# Altium schematic symbol library WR-TBL_Pluggable PCB Header.SchLib: 719 symbols (part 3 of 5) (continued)
## 691322310021
designator P?
WR-TBL Serie 322 Horizontal PCB Header, Pluggable, pitch 3.81mm, 21p; Part Number: 691322310021; Compliance: RoHS; Modularity: No; Pin Number: 21; Rated Current [UL]: 10A; Working Voltage [UL]: 300VAC; ComponentLink1Description: Manufacturer; ComponentLink1URL: http://www.we-online.de; ComponentLink2URL: https://katalog.we-online.de/em/datasheet/691322310021.pdf; ComponentLink2Description: Datasheet; Mounting Technology: THT; Packaging: Box; Operating Temperature: -40 to +105degC; PCB/Cable/Panel: PCB; Pitch: 3.81mm; Published Date: October 2019; Type: Horizontal; Publisher: Wurth Elektronik; Application: Pluggable
footprint 691322310021
pins: 1, 2, 3, 4, 5, 6, 7, 8, 9, 10, 11, 12, 13, 14, 15, 16, 17, 18, 19, 20, 21

## 691322310022
designator P?
WR-TBL Serie 322 Horizontal PCB Header, Pluggable, pitch 3.81mm, 22p; Part Number: 691322310022; Compliance: RoHS; Modularity: No; Pin Number: 22; Rated Current [UL]: 10A; Working Voltage [UL]: 300VAC; ComponentLink1Description: Manufacturer; ComponentLink1URL: http://www.we-online.de; ComponentLink2URL: https://katalog.we-online.de/em/datasheet/691322310022.pdf; ComponentLink2Description: Datasheet; Mounting Technology: THT; Packaging: Box; Operating Temperature: -40 to +105degC; PCB/Cable/Panel: PCB; Pitch: 3.81mm; Published Date: October 2019; Type: Horizontal; Publisher: Wurth Elektronik; Application: Pluggable
footprint 691322310022
pins: 1, 2, 3, 4, 5, 6, 7, 8, 9, 10, 11, 12, 13, 14, 15, 16, 17, 18, 19, 20, 21, 22

## 691322310023
designator P?
WR-TBL Serie 322 Horizontal PCB Header, Pluggable, pitch 3.81mm, 23p; Part Number: 691322310023; Compliance: RoHS; Modularity: No; Pin Number: 23; Rated Current [UL]: 10A; Working Voltage [UL]: 300VAC; ComponentLink1Description: Manufacturer; ComponentLink1URL: http://www.we-online.de; ComponentLink2URL: https://katalog.we-online.de/em/datasheet/691322310023.pdf; ComponentLink2Description: Datasheet; Mounting Technology: THT; Packaging: Box; Operating Temperature: -40 to +105degC; PCB/Cable/Panel: PCB; Pitch: 3.81mm; Published Date: October 2019; Type: Horizontal; Publisher: Wurth Elektronik; Application: Pluggable
footprint 691322310023
pins: 1, 2, 3, 4, 5, 6, 7, 8, 9, 10, 11, 12, 13, 14, 15, 16, 17, 18, 19, 20, 21, 22, 23

## 691322310024
designator P?
WR-TBL Serie 322 Horizontal PCB Header, Pluggable, pitch 3.81mm, 24p; Part Number: 691322310024; Compliance: RoHS; Modularity: No; Pin Number: 24; Rated Current [UL]: 10A; Working Voltage [UL]: 300VAC; ComponentLink1Description: Manufacturer; ComponentLink1URL: http://www.we-online.de; ComponentLink2URL: https://katalog.we-online.de/em/datasheet/691322310024.pdf; ComponentLink2Description: Datasheet; Mounting Technology: THT; Packaging: Box; Operating Temperature: -40 to +105degC; PCB/Cable/Panel: PCB; Pitch: 3.81mm; Published Date: October 2019; Type: Horizontal; Publisher: Wurth Elektronik; Application: Pluggable
footprint 691322310024
pins: 1, 2, 3, 4, 5, 6, 7, 8, 9, 10, 11, 12, 13, 14, 15, 16, 17, 18, 19, 20, 21, 22, 23, 24

## 691323100002
designator P?
WR-TBL Serie 3231 Vertical PCB Header with Flanges, Pluggable, pitch 3.5mm, 2p; Part Number: 691323100002; Compliance: RoHS; Modularity: No; Pin Number: 2; Rated Current [UL]: 10A; Working Voltage [UL]: 300VAC; ComponentLink1Description: Manufacturer; ComponentLink1URL: http://www.we-online.de; ComponentLink2URL: https://katalog.we-online.de/em/datasheet/691323100002.pdf; ComponentLink2Description: Datasheet; Mounting Technology: THT; Packaging: Box; Operating Temperature: -40 to +105degC; PCB/Cable/Panel: PCB; Pitch: 3.5mm; Published Date: October 2019; Type: Vertical; Publisher: Wurth Elektronik; Application: Pluggable
footprint 691323100002
pins: 1, 2

## 691323100003
designator P?
WR-TBL Serie 3231 Vertical PCB Header with Flanges, Pluggable, pitch 3.5mm, 3p; Part Number: 691323100003; Compliance: RoHS; Modularity: No; Pin Number: 3; Rated Current [UL]: 10A; Working Voltage [UL]: 300VAC; ComponentLink1Description: Manufacturer; ComponentLink1URL: http://www.we-online.de; ComponentLink2URL: https://katalog.we-online.de/em/datasheet/691323100003.pdf; ComponentLink2Description: Datasheet; Mounting Technology: THT; Packaging: Box; Operating Temperature: -40 to +105degC; PCB/Cable/Panel: PCB; Pitch: 3.5mm; Published Date: October 2019; Type: Vertical; Publisher: Wurth Elektronik; Application: Pluggable
footprint 691323100003
pins: 1, 2, 3

## 691323100004
designator P?
WR-TBL Serie 3231 Vertical PCB Header with Flanges, Pluggable, pitch 3.5mm, 4p; Part Number: 691323100004; Compliance: RoHS; Modularity: No; Pin Number: 4; Rated Current [UL]: 10A; Working Voltage [UL]: 300VAC; ComponentLink1Description: Manufacturer; ComponentLink1URL: http://www.we-online.de; ComponentLink2URL: https://katalog.we-online.de/em/datasheet/691323100004.pdf; ComponentLink2Description: Datasheet; Mounting Technology: THT; Packaging: Box; Operating Temperature: -40 to +105degC; PCB/Cable/Panel: PCB; Pitch: 3.5mm; Published Date: October 2019; Type: Vertical; Publisher: Wurth Elektronik; Application: Pluggable
footprint 691323100004
pins: 1, 2, 3, 4

## 691323100005
designator P?
WR-TBL Serie 3231 Vertical PCB Header with Flanges, Pluggable, pitch 3.5mm, 5p; Part Number: 691323100005; Compliance: RoHS; Modularity: No; Pin Number: 5; Rated Current [UL]: 10A; Working Voltage [UL]: 300VAC; ComponentLink1Description: Manufacturer; ComponentLink1URL: http://www.we-online.de; ComponentLink2URL: https://katalog.we-online.de/em/datasheet/691323100005.pdf; ComponentLink2Description: Datasheet; Mounting Technology: THT; Packaging: Box; Operating Temperature: -40 to +105degC; PCB/Cable/Panel: PCB; Pitch: 3.5mm; Published Date: October 2019; Type: Vertical; Publisher: Wurth Elektronik; Application: Pluggable
footprint 691323100005
pins: 1, 2, 3, 4, 5

## 691323100006
designator P?
WR-TBL Serie 3231 Vertical PCB Header with Flanges, Pluggable, pitch 3.5mm, 6p; Part Number: 691323100006; Compliance: RoHS; Modularity: No; Pin Number: 6; Rated Current [UL]: 10A; Working Voltage [UL]: 300VAC; ComponentLink1Description: Manufacturer; ComponentLink1URL: http://www.we-online.de; ComponentLink2URL: https://katalog.we-online.de/em/datasheet/691323100006.pdf; ComponentLink2Description: Datasheet; Mounting Technology: THT; Packaging: Box; Operating Temperature: -40 to +105degC; PCB/Cable/Panel: PCB; Pitch: 3.5mm; Published Date: October 2019; Type: Vertical; Publisher: Wurth Elektronik; Application: Pluggable
footprint 691323100006
pins: 1, 2, 3, 4, 5, 6

## 691323100007
designator P?
WR-TBL Serie 3231 Vertical PCB Header with Flanges, Pluggable, pitch 3.5mm, 7p; Part Number: 691323100007; Compliance: RoHS; Modularity: No; Pin Number: 7; Rated Current [UL]: 10A; Working Voltage [UL]: 300VAC; ComponentLink1Description: Manufacturer; ComponentLink1URL: http://www.we-online.de; ComponentLink2URL: https://katalog.we-online.de/em/datasheet/691323100007.pdf; ComponentLink2Description: Datasheet; Mounting Technology: THT; Packaging: Box; Operating Temperature: -40 to +105degC; PCB/Cable/Panel: PCB; Pitch: 3.5mm; Published Date: October 2019; Type: Vertical; Publisher: Wurth Elektronik; Application: Pluggable
footprint 691323100007
pins: 1, 2, 3, 4, 5, 6, 7

## 691323100008
designator P?
WR-TBL Serie 3231 Vertical PCB Header with Flanges, Pluggable, pitch 3.5mm, 8p; Part Number: 691323100008; Compliance: RoHS; Modularity: No; Pin Number: 8; Rated Current [UL]: 10A; Working Voltage [UL]: 300VAC; ComponentLink1Description: Manufacturer; ComponentLink1URL: http://www.we-online.de; ComponentLink2URL: https://katalog.we-online.de/em/datasheet/691323100008.pdf; ComponentLink2Description: Datasheet; Mounting Technology: THT; Packaging: Box; Operating Temperature: -40 to +105degC; PCB/Cable/Panel: PCB; Pitch: 3.5mm; Published Date: October 2019; Type: Vertical; Publisher: Wurth Elektronik; Application: Pluggable
footprint 691323100008
pins: 1, 2, 3, 4, 5, 6, 7, 8

## 691323100012
designator P?
WR-TBL Serie 3231 Vertical PCB Header with Flanges, Pluggable, pitch 3.5mm, 12p; Part Number: 691323100012; Compliance: RoHS; Modularity: No; Pin Number: 12; Rated Current [UL]: 10A; Working Voltage [UL]: 300VAC; ComponentLink1Description: Manufacturer; ComponentLink1URL: http://www.we-online.de; ComponentLink2URL: https://katalog.we-online.de/em/datasheet/691323100012.pdf; ComponentLink2Description: Datasheet; Mounting Technology: THT; Packaging: Box; Operating Temperature: -40 to +105degC; PCB/Cable/Panel: PCB; Pitch: 3.5mm; Published Date: October 2019; Type: Vertical; Publisher: Wurth Elektronik; Application: Pluggable
footprint 691323100012
pins: 1, 2, 3, 4, 5, 6, 7, 8, 9, 10, 11, 12

## 691323300002
designator P?
WR-TBL Serie 3233 Vertical PCB Header with Flanges, Pluggable, pitch 3.81mm, 2p; Part Number: 691323300002; Compliance: RoHS; Modularity: No; Pin Number: 2; Rated Current [UL]: 10A; Working Voltage [UL]: 300VAC; ComponentLink1Description: Manufacturer; ComponentLink1URL: http://www.we-online.de; ComponentLink2URL: https://katalog.we-online.de/em/datasheet/691323300002.pdf; ComponentLink2Description: Datasheet; Mounting Technology: THT; Packaging: Box; Operating Temperature: -40 to +105degC; PCB/Cable/Panel: PCB; Pitch: 3.81mm; Published Date: October 2019; Type: Vertical; Publisher: Wurth Elektronik; Application: Pluggable
footprint 691323300002
pins: 1, 2

## 691323300003
designator P?
WR-TBL Serie 3233 Vertical PCB Header with Flanges, Pluggable, pitch 3.81mm, 3p; Part Number: 691323300003; Compliance: RoHS; Modularity: No; Pin Number: 3; Rated Current [UL]: 10A; Working Voltage [UL]: 300VAC; ComponentLink1Description: Manufacturer; ComponentLink1URL: http://www.we-online.de; ComponentLink2URL: https://katalog.we-online.de/em/datasheet/691323300003.pdf; ComponentLink2Description: Datasheet; Mounting Technology: THT; Packaging: Box; Operating Temperature: -40 to +105degC; PCB/Cable/Panel: PCB; Pitch: 3.81mm; Published Date: October 2019; Type: Vertical; Publisher: Wurth Elektronik; Application: Pluggable
footprint 691323300003
pins: 1, 2, 3

## 691323300004
designator P?
WR-TBL Serie 3233 Vertical PCB Header with Flanges, Pluggable, pitch 3.81mm, 4p; Part Number: 691323300004; Compliance: RoHS; Modularity: No; Pin Number: 4; Rated Current [UL]: 10A; Working Voltage [UL]: 300VAC; ComponentLink1Description: Manufacturer; ComponentLink1URL: http://www.we-online.de; ComponentLink2URL: https://katalog.we-online.de/em/datasheet/691323300004.pdf; ComponentLink2Description: Datasheet; Mounting Technology: THT; Packaging: Box; Operating Temperature: -40 to +105degC; PCB/Cable/Panel: PCB; Pitch: 3.81mm; Published Date: October 2019; Type: Vertical; Publisher: Wurth Elektronik; Application: Pluggable
footprint 691323300004
pins: 1, 2, 3, 4

## 691323300005
designator P?
WR-TBL Serie 3233 Vertical PCB Header with Flanges, Pluggable, pitch 3.81mm, 5p; Part Number: 691323300005; Compliance: RoHS; Modularity: No; Pin Number: 5; Rated Current [UL]: 10A; Working Voltage [UL]: 300VAC; ComponentLink1Description: Manufacturer; ComponentLink1URL: http://www.we-online.de; ComponentLink2URL: https://katalog.we-online.de/em/datasheet/691323300005.pdf; ComponentLink2Description: Datasheet; Mounting Technology: THT; Packaging: Box; Operating Temperature: -40 to +105degC; PCB/Cable/Panel: PCB; Pitch: 3.81mm; Published Date: October 2019; Type: Vertical; Publisher: Wurth Elektronik; Application: Pluggable
footprint 691323300005
pins: 1, 2, 3, 4, 5

## 691323300006
designator P?
WR-TBL Serie 3233 Vertical PCB Header with Flanges, Pluggable, pitch 3.81mm, 6p; Part Number: 691323300006; Compliance: RoHS; Modularity: No; Pin Number: 6; Rated Current [UL]: 10A; Working Voltage [UL]: 300VAC; ComponentLink1Description: Manufacturer; ComponentLink1URL: http://www.we-online.de; ComponentLink2URL: https://katalog.we-online.de/em/datasheet/691323300006.pdf; ComponentLink2Description: Datasheet; Mounting Technology: THT; Packaging: Box; Operating Temperature: -40 to +105degC; PCB/Cable/Panel: PCB; Pitch: 3.81mm; Published Date: October 2019; Type: Vertical; Publisher: Wurth Elektronik; Application: Pluggable
footprint 691323300006
pins: 1, 2, 3, 4, 5, 6

## 691323300007
designator P?
WR-TBL Serie 3233 Vertical PCB Header with Flanges, Pluggable, pitch 3.81mm, 7p; Part Number: 691323300007; Compliance: RoHS; Modularity: No; Pin Number: 7; Rated Current [UL]: 10A; Working Voltage [UL]: 300VAC; ComponentLink1Description: Manufacturer; ComponentLink1URL: http://www.we-online.de; ComponentLink2URL: https://katalog.we-online.de/em/datasheet/691323300007.pdf; ComponentLink2Description: Datasheet; Mounting Technology: THT; Packaging: Box; Operating Temperature: -40 to +105degC; PCB/Cable/Panel: PCB; Pitch: 3.81mm; Published Date: October 2019; Type: Vertical; Publisher: Wurth Elektronik; Application: Pluggable
footprint 691323300007
pins: 1, 2, 3, 4, 5, 6, 7

## 691323300008
designator P?
WR-TBL Serie 3233 Vertical PCB Header with Flanges, Pluggable, pitch 3.81mm, 8p; Part Number: 691323300008; Compliance: RoHS; Modularity: No; Pin Number: 8; Rated Current [UL]: 10A; Working Voltage [UL]: 300VAC; ComponentLink1Description: Manufacturer; ComponentLink1URL: http://www.we-online.de; ComponentLink2URL: https://katalog.we-online.de/em/datasheet/691323300008.pdf; ComponentLink2Description: Datasheet; Mounting Technology: THT; Packaging: Box; Operating Temperature: -40 to +105degC; PCB/Cable/Panel: PCB; Pitch: 3.81mm; Published Date: October 2019; Type: Vertical; Publisher: Wurth Elektronik; Application: Pluggable
footprint 691323300008
pins: 1, 2, 3, 4, 5, 6, 7, 8

## 691323300012
designator P?
WR-TBL Serie 3233 Vertical PCB Header with Flanges, Pluggable, pitch 3.81mm, 12p; Part Number: 691323300012; Compliance: RoHS; Modularity: No; Pin Number: 12; Rated Current [UL]: 10A; Working Voltage [UL]: 300VAC; ComponentLink1Description: Manufacturer; ComponentLink1URL: http://www.we-online.de; ComponentLink2URL: https://katalog.we-online.de/em/datasheet/691323300012.pdf; ComponentLink2Description: Datasheet; Mounting Technology: THT; Packaging: Box; Operating Temperature: -40 to +105degC; PCB/Cable/Panel: PCB; Pitch: 3.81mm; Published Date: October 2019; Type: Vertical; Publisher: Wurth Elektronik; Application: Pluggable
footprint 691323300012
pins: 1, 2, 3, 4, 5, 6, 7, 8, 9, 10, 11, 12

## 691325110002
designator P?
WR-TBL Serie 3251 Horizontal PCB Header with Flanges, Pluggable, pitch 3.5mm, 2p; Part Number: 691325110002; Compliance: RoHS; Modularity: No; Pin Number: 2; Rated Current [UL]: 10A; Working Voltage [UL]: 300VAC; ComponentLink1Description: Manufacturer; ComponentLink1URL: http://www.we-online.de; ComponentLink2URL: https://katalog.we-online.de/em/datasheet/691325110002.pdf; ComponentLink2Description: Datasheet; Mounting Technology: THT; Packaging: Box; Operating Temperature: -40 to +105degC; PCB/Cable/Panel: PCB; Pitch: 3.5mm; Published Date: October 2019; Type: Horizontal; Publisher: Wurth Elektronik; Application: Pluggable
footprint 691325110002
pins: 1, 2

## 691325110003
designator P?
WR-TBL Serie 3251 Horizontal PCB Header with Flanges, Pluggable, pitch 3.5mm, 3p; Part Number: 691325110003; Compliance: RoHS; Modularity: No; Pin Number: 3; Rated Current [UL]: 10A; Working Voltage [UL]: 300VAC; ComponentLink1Description: Manufacturer; ComponentLink1URL: http://www.we-online.de; ComponentLink2URL: https://katalog.we-online.de/em/datasheet/691325110003.pdf; ComponentLink2Description: Datasheet; Mounting Technology: THT; Packaging: Box; Operating Temperature: -40 to +105degC; PCB/Cable/Panel: PCB; Pitch: 3.5mm; Published Date: October 2019; Type: Horizontal; Publisher: Wurth Elektronik; Application: Pluggable
footprint 691325110003
pins: 1, 2, 3

## 691325110004
designator P?
WR-TBL Serie 3251 Horizontal PCB Header with Flanges, Pluggable, pitch 3.5mm, 4p; Part Number: 691325110004; Compliance: RoHS; Modularity: No; Pin Number: 4; Rated Current [UL]: 10A; Working Voltage [UL]: 300VAC; ComponentLink1Description: Manufacturer; ComponentLink1URL: http://www.we-online.de; ComponentLink2URL: https://katalog.we-online.de/em/datasheet/691325110004.pdf; ComponentLink2Description: Datasheet; Mounting Technology: THT; Packaging: Box; Operating Temperature: -40 to +105degC; PCB/Cable/Panel: PCB; Pitch: 3.5mm; Published Date: October 2019; Type: Horizontal; Publisher: Wurth Elektronik; Application: Pluggable
footprint 691325110004
pins: 1, 2, 3, 4

## 691325110005
designator P?
WR-TBL Serie 3251 Horizontal PCB Header with Flanges, Pluggable, pitch 3.5mm, 5p; Part Number: 691325110005; Compliance: RoHS; Modularity: No; Pin Number: 5; Rated Current [UL]: 10A; Working Voltage [UL]: 300VAC; ComponentLink1Description: Manufacturer; ComponentLink1URL: http://www.we-online.de; ComponentLink2URL: https://katalog.we-online.de/em/datasheet/691325110005.pdf; ComponentLink2Description: Datasheet; Mounting Technology: THT; Packaging: Box; Operating Temperature: -40 to +105degC; PCB/Cable/Panel: PCB; Pitch: 3.5mm; Published Date: October 2019; Type: Horizontal; Publisher: Wurth Elektronik; Application: Pluggable
footprint 691325110005
pins: 1, 2, 3, 4, 5

## 691325110006
designator P?
WR-TBL Serie 3251 Horizontal PCB Header with Flanges, Pluggable, pitch 3.5mm, 6p; Part Number: 691325110006; Compliance: RoHS; Modularity: No; Pin Number: 6; Rated Current [UL]: 10A; Working Voltage [UL]: 300VAC; ComponentLink1Description: Manufacturer; ComponentLink1URL: http://www.we-online.de; ComponentLink2URL: https://katalog.we-online.de/em/datasheet/691325110006.pdf; ComponentLink2Description: Datasheet; Mounting Technology: THT; Packaging: Box; Operating Temperature: -40 to +105degC; PCB/Cable/Panel: PCB; Pitch: 3.5mm; Published Date: October 2019; Type: Horizontal; Publisher: Wurth Elektronik; Application: Pluggable
footprint 691325110006
pins: 1, 2, 3, 4, 5, 6

## 691325110007
designator P?
WR-TBL Serie 3251 Horizontal PCB Header with Flanges, Pluggable, pitch 3.5mm, 7p; Part Number: 691325110007; Compliance: RoHS; Modularity: No; Pin Number: 7; Rated Current [UL]: 10A; Working Voltage [UL]: 300VAC; ComponentLink1Description: Manufacturer; ComponentLink1URL: http://www.we-online.de; ComponentLink2URL: https://katalog.we-online.de/em/datasheet/691325110007.pdf; ComponentLink2Description: Datasheet; Mounting Technology: THT; Packaging: Box; Operating Temperature: -40 to +105degC; PCB/Cable/Panel: PCB; Pitch: 3.5mm; Published Date: October 2019; Type: Horizontal; Publisher: Wurth Elektronik; Application: Pluggable
footprint 691325110007
pins: 1, 2, 3, 4, 5, 6, 7

## 691325110008
designator P?
WR-TBL Serie 3251 Horizontal PCB Header with Flanges, Pluggable, pitch 3.5mm, 8p; Part Number: 691325110008; Compliance: RoHS; Modularity: No; Pin Number: 8; Rated Current [UL]: 10A; Working Voltage [UL]: 300VAC; ComponentLink1Description: Manufacturer; ComponentLink1URL: http://www.we-online.de; ComponentLink2URL: https://katalog.we-online.de/em/datasheet/691325110008.pdf; ComponentLink2Description: Datasheet; Mounting Technology: THT; Packaging: Box; Operating Temperature: -40 to +105degC; PCB/Cable/Panel: PCB; Pitch: 3.5mm; Published Date: October 2019; Type: Horizontal; Publisher: Wurth Elektronik; Application: Pluggable
footprint 691325110008
pins: 1, 2, 3, 4, 5, 6, 7, 8

## 691325110012
designator P?
WR-TBL Serie 3251 Horizontal PCB Header with Flanges, Pluggable, pitch 3.5mm, 12p; Part Number: 691325110012; Compliance: RoHS; Modularity: No; Pin Number: 12; Rated Current [UL]: 10A; Working Voltage [UL]: 300VAC; ComponentLink1Description: Manufacturer; ComponentLink1URL: http://www.we-online.de; ComponentLink2URL: https://katalog.we-online.de/em/datasheet/691325110012.pdf; ComponentLink2Description: Datasheet; Mounting Technology: THT; Packaging: Box; Operating Temperature: -40 to +105degC; PCB/Cable/Panel: PCB; Pitch: 3.5mm; Published Date: October 2019; Type: Horizontal; Publisher: Wurth Elektronik; Application: Pluggable
footprint 691325110012
pins: 1, 2, 3, 4, 5, 6, 7, 8, 9, 10, 11, 12

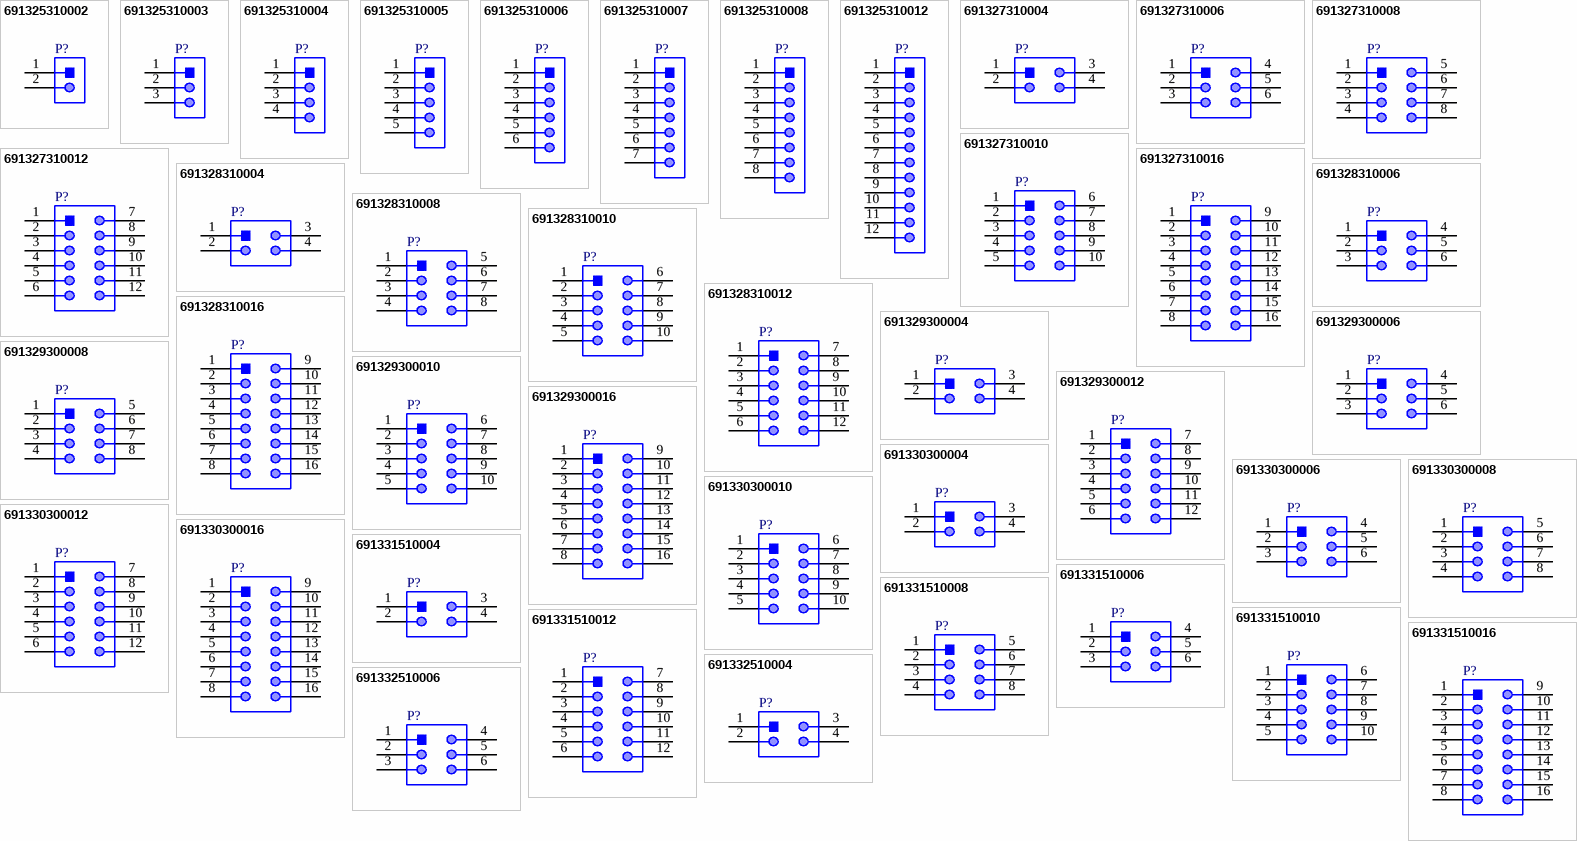
[diagram p11: symbols 691325310002 to 691332510006]

## 691325310002
designator P?
WR-TBL Serie 3253 Horizontal PCB Header with Flanges, Pluggable, pitch 3.81mm, 2p; Part Number: 691325310002; Compliance: RoHS; Modularity: No; Pin Number: 2; Rated Current [UL]: 10A; Working Voltage [UL]: 300VAC; ComponentLink1Description: Manufacturer; ComponentLink1URL: http://www.we-online.de; ComponentLink2URL: https://katalog.we-online.de/em/datasheet/691325310002.pdf; ComponentLink2Description: Datasheet; Mounting Technology: THT; Packaging: Box; Operating Temperature: -40 to +105degC; PCB/Cable/Panel: PCB; Pitch: 3.81mm; Published Date: October 2019; Type: Horizontal; Publisher: Wurth Elektronik; Application: Pluggable
footprint 691325310002
pins: 1, 2

## 691325310003
designator P?
WR-TBL Serie 3253 Horizontal PCB Header with Flanges, Pluggable, pitch 3.81mm, 3p; Part Number: 691325310003; Compliance: RoHS; Modularity: No; Pin Number: 3; Rated Current [UL]: 10A; Working Voltage [UL]: 300VAC; ComponentLink1Description: Manufacturer; ComponentLink1URL: http://www.we-online.de; ComponentLink2URL: https://katalog.we-online.de/em/datasheet/691325310003.pdf; ComponentLink2Description: Datasheet; Mounting Technology: THT; Packaging: Box; Operating Temperature: -40 to +105degC; PCB/Cable/Panel: PCB; Pitch: 3.81mm; Published Date: October 2019; Type: Horizontal; Publisher: Wurth Elektronik; Application: Pluggable
footprint 691325310003
pins: 1, 2, 3

## 691325310004
designator P?
WR-TBL Serie 3253 Horizontal PCB Header with Flanges, Pluggable, pitch 3.81mm, 4p; Part Number: 691325310004; Compliance: RoHS; Modularity: No; Pin Number: 4; Rated Current [UL]: 10A; Working Voltage [UL]: 300VAC; ComponentLink1Description: Manufacturer; ComponentLink1URL: http://www.we-online.de; ComponentLink2URL: https://katalog.we-online.de/em/datasheet/691325310004.pdf; ComponentLink2Description: Datasheet; Mounting Technology: THT; Packaging: Box; Operating Temperature: -40 to +105degC; PCB/Cable/Panel: PCB; Pitch: 3.81mm; Published Date: October 2019; Type: Horizontal; Publisher: Wurth Elektronik; Application: Pluggable
footprint 691325310004
pins: 1, 2, 3, 4

## 691325310005
designator P?
WR-TBL Serie 3253 Horizontal PCB Header with Flanges, Pluggable, pitch 3.81mm, 5p; Part Number: 691325310005; Compliance: RoHS; Modularity: No; Pin Number: 5; Rated Current [UL]: 10A; Working Voltage [UL]: 300VAC; ComponentLink1Description: Manufacturer; ComponentLink1URL: http://www.we-online.de; ComponentLink2URL: https://katalog.we-online.de/em/datasheet/691325310005.pdf; ComponentLink2Description: Datasheet; Mounting Technology: THT; Packaging: Box; Operating Temperature: -40 to +105degC; PCB/Cable/Panel: PCB; Pitch: 3.81mm; Published Date: October 2019; Type: Horizontal; Publisher: Wurth Elektronik; Application: Pluggable
footprint 691325310005
pins: 1, 2, 3, 4, 5

## 691325310006
designator P?
WR-TBL Serie 3253 Horizontal PCB Header with Flanges, Pluggable, pitch 3.81mm, 6p; Part Number: 691325310006; Compliance: RoHS; Modularity: No; Pin Number: 6; Rated Current [UL]: 10A; Working Voltage [UL]: 300VAC; ComponentLink1Description: Manufacturer; ComponentLink1URL: http://www.we-online.de; ComponentLink2URL: https://katalog.we-online.de/em/datasheet/691325310006.pdf; ComponentLink2Description: Datasheet; Mounting Technology: THT; Packaging: Box; Operating Temperature: -40 to +105degC; PCB/Cable/Panel: PCB; Pitch: 3.81mm; Published Date: October 2019; Type: Horizontal; Publisher: Wurth Elektronik; Application: Pluggable
footprint 691325310006
pins: 1, 2, 3, 4, 5, 6

## 691325310007
designator P?
WR-TBL Serie 3253 Horizontal PCB Header with Flanges, Pluggable, pitch 3.81mm, 7p; Part Number: 691325310007; Compliance: RoHS; Modularity: No; Pin Number: 7; Rated Current [UL]: 10A; Working Voltage [UL]: 300VAC; ComponentLink1Description: Manufacturer; ComponentLink1URL: http://www.we-online.de; ComponentLink2URL: https://katalog.we-online.de/em/datasheet/691325310007.pdf; ComponentLink2Description: Datasheet; Mounting Technology: THT; Packaging: Box; Operating Temperature: -40 to +105degC; PCB/Cable/Panel: PCB; Pitch: 3.81mm; Published Date: October 2019; Type: Horizontal; Publisher: Wurth Elektronik; Application: Pluggable
footprint 691325310007
pins: 1, 2, 3, 4, 5, 6, 7

## 691325310008
designator P?
WR-TBL Serie 3253 Horizontal PCB Header with Flanges, Pluggable, pitch 3.81mm, 8p; Part Number: 691325310008; Compliance: RoHS; Modularity: No; Pin Number: 8; Rated Current [UL]: 10A; Working Voltage [UL]: 300VAC; ComponentLink1Description: Manufacturer; ComponentLink1URL: http://www.we-online.de; ComponentLink2URL: https://katalog.we-online.de/em/datasheet/691325310008.pdf; ComponentLink2Description: Datasheet; Mounting Technology: THT; Packaging: Box; Operating Temperature: -40 to +105degC; PCB/Cable/Panel: PCB; Pitch: 3.81mm; Published Date: October 2019; Type: Horizontal; Publisher: Wurth Elektronik; Application: Pluggable
footprint 691325310008
pins: 1, 2, 3, 4, 5, 6, 7, 8

## 691325310012
designator P?
WR-TBL Serie 3253 Horizontal PCB Header with Flanges, Pluggable, pitch 3.81mm, 12p; Part Number: 691325310012; Compliance: RoHS; Modularity: No; Pin Number: 12; Rated Current [UL]: 10A; Working Voltage [UL]: 300VAC; ComponentLink1Description: Manufacturer; ComponentLink1URL: http://www.we-online.de; ComponentLink2URL: https://katalog.we-online.de/em/datasheet/691325310012.pdf; ComponentLink2Description: Datasheet; Mounting Technology: THT; Packaging: Box; Operating Temperature: -40 to +105degC; PCB/Cable/Panel: PCB; Pitch: 3.81mm; Published Date: October 2019; Type: Horizontal; Publisher: Wurth Elektronik; Application: Pluggable
footprint 691325310012
pins: 1, 2, 3, 4, 5, 6, 7, 8, 9, 10, 11, 12

## 691327310004
designator P?
WR-TBL Serie 3273 Double Level Horizontal PCB Header with Flanges, Pluggable, pitch 3.81mm, 4p; Part Number: 691327310004; Compliance: RoHS; Modularity: No; Pin Number: 4; Rated Current [UL]: 10A; Working Voltage [UL]: 300VAC; ComponentLink1Description: Manufacturer; ComponentLink1URL: http://www.we-online.de; ComponentLink2URL: https://katalog.we-online.de/em/datasheet/691327310004.pdf; ComponentLink2Description: Datasheet; Mounting Technology: THT; Packaging: Box; Operating Temperature: -40 to +105degC; PCB/Cable/Panel: PCB; Pitch: 3.81mm; Published Date: October 2019; Type: Double Level Horizontal; Publisher: Wurth Elektronik; Application: Pluggable
footprint 691327310004
pins: 1, 2, 3, 4

## 691327310006
designator P?
WR-TBL Serie 3273 Double Level Horizontal PCB Header with Flanges, Pluggable, pitch 3.81mm, 6p; Part Number: 691327310006; Compliance: RoHS; Modularity: No; Pin Number: 6; Rated Current [UL]: 10A; Working Voltage [UL]: 300VAC; ComponentLink1Description: Manufacturer; ComponentLink1URL: http://www.we-online.de; ComponentLink2URL: https://katalog.we-online.de/em/datasheet/691327310006.pdf; ComponentLink2Description: Datasheet; Mounting Technology: THT; Packaging: Box; Operating Temperature: -40 to +105degC; PCB/Cable/Panel: PCB; Pitch: 3.81mm; Published Date: October 2019; Type: Double Level Horizontal; Publisher: Wurth Elektronik; Application: Pluggable
footprint 691327310006
pins: 1, 2, 3, 4, 5, 6

## 691327310008
designator P?
WR-TBL Serie 3273 Double Level Horizontal PCB Header with Flanges, Pluggable, pitch 3.81mm, 8p; Part Number: 691327310008; Compliance: RoHS; Modularity: No; Pin Number: 8; Rated Current [UL]: 10A; Working Voltage [UL]: 300VAC; ComponentLink1Description: Manufacturer; ComponentLink1URL: http://www.we-online.de; ComponentLink2URL: https://katalog.we-online.de/em/datasheet/691327310008.pdf; ComponentLink2Description: Datasheet; Mounting Technology: THT; Packaging: Box; Operating Temperature: -40 to +105degC; PCB/Cable/Panel: PCB; Pitch: 3.81mm; Published Date: October 2019; Type: Double Level Horizontal; Publisher: Wurth Elektronik; Application: Pluggable
footprint 691327310008
pins: 1, 2, 3, 4, 5, 6, 7, 8

## 691327310010
designator P?
WR-TBL Serie 3273 Double Level Horizontal PCB Header with Flanges, Pluggable, pitch 3.81mm, 10p; Part Number: 691327310010; Compliance: RoHS; Modularity: No; Pin Number: 10; Rated Current [UL]: 10A; Working Voltage [UL]: 300VAC; ComponentLink1Description: Manufacturer; ComponentLink1URL: http://www.we-online.de; ComponentLink2URL: https://katalog.we-online.de/em/datasheet/691327310010.pdf; ComponentLink2Description: Datasheet; Mounting Technology: THT; Packaging: Box; Operating Temperature: -40 to +105degC; PCB/Cable/Panel: PCB; Pitch: 3.81mm; Published Date: October 2019; Type: Double Level Horizontal; Publisher: Wurth Elektronik; Application: Pluggable
footprint 691327310010
pins: 1, 2, 3, 4, 5, 6, 7, 8, 9, 10

## 691327310012
designator P?
WR-TBL Serie 3273 Double Level Horizontal PCB Header with Flanges, Pluggable, pitch 3.81mm, 12p; Part Number: 691327310012; Compliance: RoHS; Modularity: No; Pin Number: 12; Rated Current [UL]: 10A; Working Voltage [UL]: 300VAC; ComponentLink1Description: Manufacturer; ComponentLink1URL: http://www.we-online.de; ComponentLink2URL: https://katalog.we-online.de/em/datasheet/691327310012.pdf; ComponentLink2Description: Datasheet; Mounting Technology: THT; Packaging: Box; Operating Temperature: -40 to +105degC; PCB/Cable/Panel: PCB; Pitch: 3.81mm; Published Date: October 2019; Type: Double Level Horizontal; Publisher: Wurth Elektronik; Application: Pluggable
footprint 691327310012
pins: 1, 2, 3, 4, 5, 6, 7, 8, 9, 10, 11, 12

## 691327310016
designator P?
WR-TBL Serie 3273 Double Level Horizontal PCB Header with Flanges, Pluggable, pitch 3.81mm, 16p; Part Number: 691327310016; Compliance: RoHS; Modularity: No; Pin Number: 16; Rated Current [UL]: 10A; Working Voltage [UL]: 300VAC; ComponentLink1Description: Manufacturer; ComponentLink1URL: http://www.we-online.de; ComponentLink2URL: https://katalog.we-online.de/em/datasheet/691327310016.pdf; ComponentLink2Description: Datasheet; Mounting Technology: THT; Packaging: Box; Operating Temperature: -40 to +105degC; PCB/Cable/Panel: PCB; Pitch: 3.81mm; Published Date: October 2019; Type: Double Level Horizontal; Publisher: Wurth Elektronik; Application: Pluggable
footprint 691327310016
pins: 1, 2, 3, 4, 5, 6, 7, 8, 9, 10, 11, 12, 13, 14, 15, 16

## 691328310004
designator P?
WR-TBL Serie 3283 Double Level Horizontal PCB Header with Flanges & Nut Type, Pluggable, pitch 3.81mm, 4p; Part Number: 691328310004; Compliance: RoHS; Modularity: No; Pin Number: 4; Rated Current [UL]: 10A; Working Voltage [UL]: 300VAC; ComponentLink1Description: Manufacturer; ComponentLink1URL: http://www.we-online.de; ComponentLink2URL: https://katalog.we-online.de/em/datasheet/691328310004.pdf; ComponentLink2Description: Datasheet; Mounting Technology: THT; Packaging: Box; Operating Temperature: -40 to +105degC; PCB/Cable/Panel: PCB; Pitch: 3.81mm; Published Date: October 2019; Type: Double Level Horizontal; Publisher: Wurth Elektronik; Application: Pluggable
footprint 691328310004
pins: 1, 2, 3, 4

## 691328310006
designator P?
WR-TBL Serie 3283 Double Level Horizontal PCB Header with Flanges & Nut Type, Pluggable, pitch 3.81mm, 6p; Part Number: 691328310006; Compliance: RoHS; Modularity: No; Pin Number: 6; Rated Current [UL]: 10A; Working Voltage [UL]: 300VAC; ComponentLink1Description: Manufacturer; ComponentLink1URL: http://www.we-online.de; ComponentLink2URL: https://katalog.we-online.de/em/datasheet/691328310006.pdf; ComponentLink2Description: Datasheet; Mounting Technology: THT; Packaging: Box; Operating Temperature: -40 to +105degC; PCB/Cable/Panel: PCB; Pitch: 3.81mm; Published Date: October 2019; Type: Double Level Horizontal; Publisher: Wurth Elektronik; Application: Pluggable
footprint 691328310006
pins: 1, 2, 3, 4, 5, 6